# Altium footprint library pcb.PcbLib: 397 footprints (part 12 of 25)
Each footprint in its own frame and in the unit in brackets; x right, y up, seen from the top. Pads: shape width x height; smd on the part's side, far side on the other; paste and mask are expansions set on the pad; w line width, h text height; cw(c..) or ccw(c..) is an arc to the next point about the centre after c.
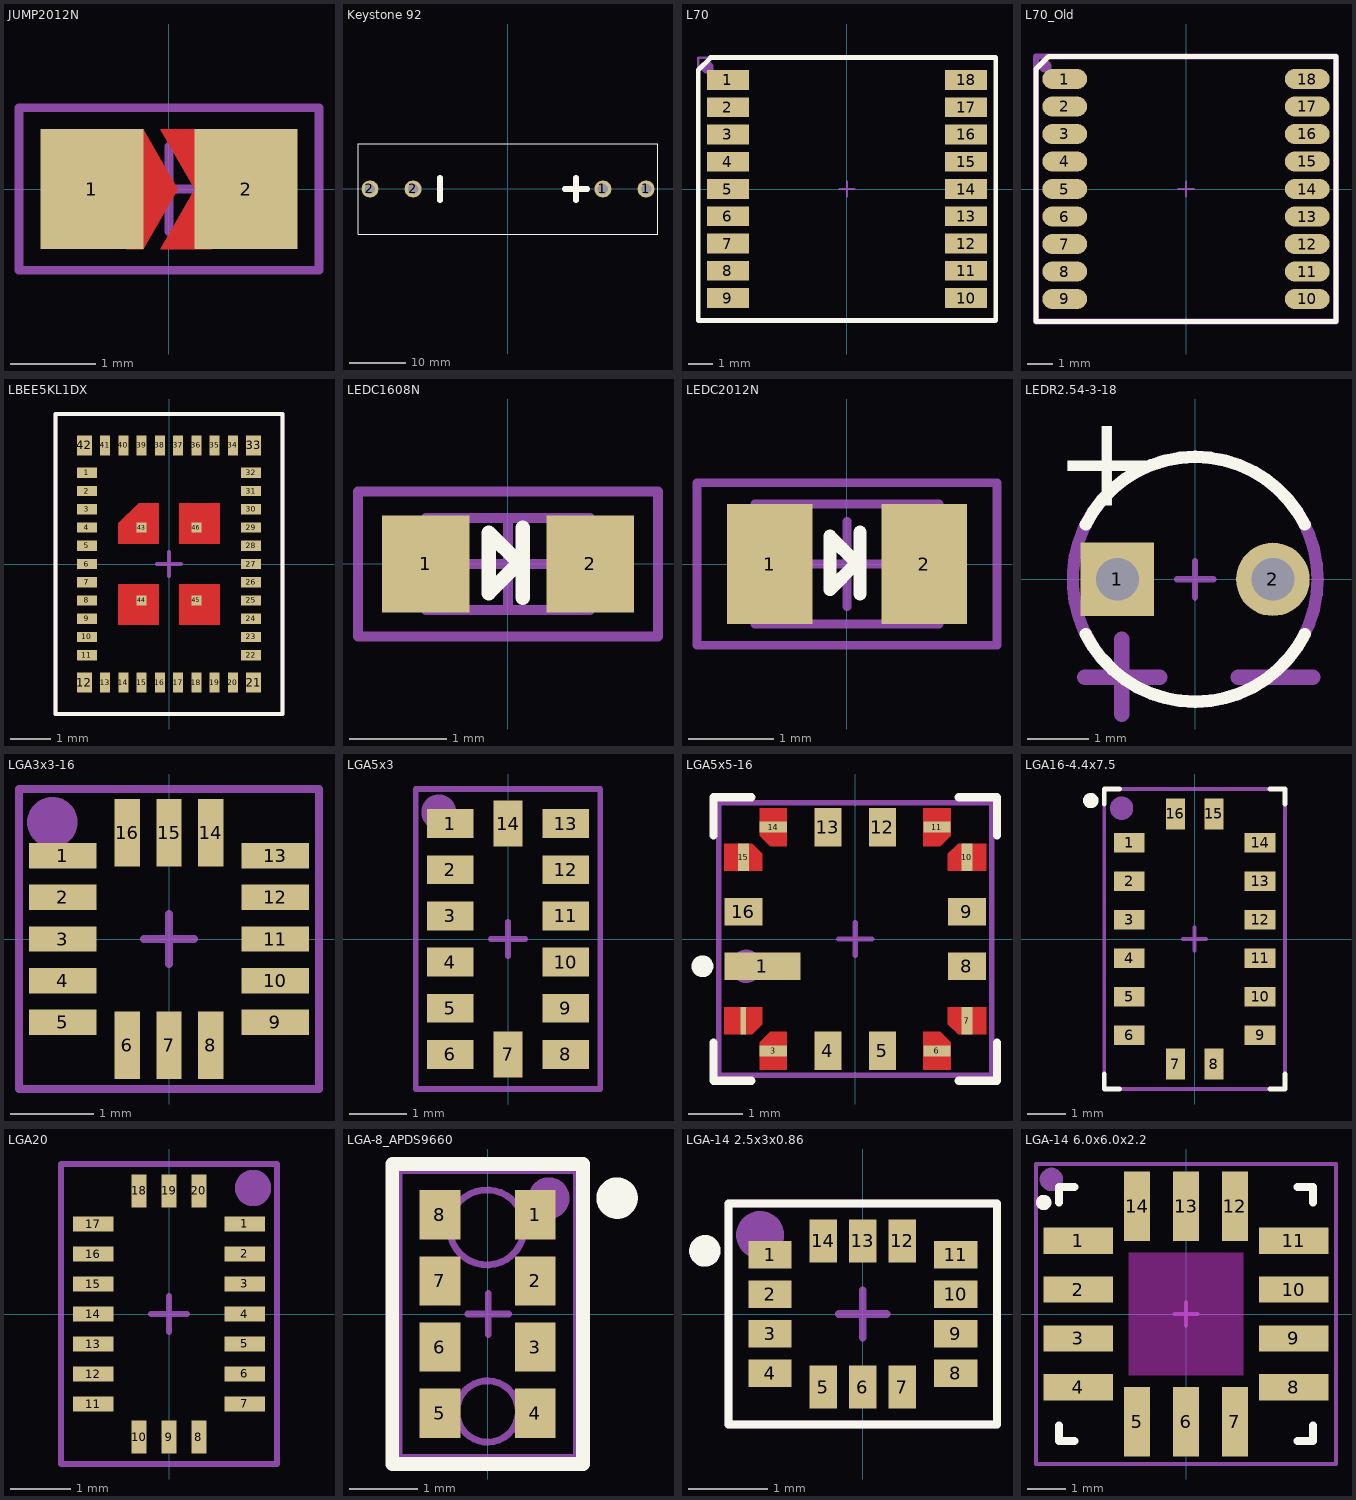
[diagram p11: the footprints below, top view; thin cyan lines are the x and y axes]

## JUMP2012N [mm]
height 0.65
pads (2):
  rect 1.2x1.4 smd: 1(-0.9,0) 2(0.9,0)
Top Layer:
  region: -0.5,0.7 -0.3,0.7 0.1,0 -0.3,-0.7 -0.5,-0.7
  region: 0.5,0.7 -0.1,0.7 0.3,0 -0.1,-0.7 0.5,-0.7
Top Solder:
  rectangle: -0.6,-0.8 0.4,0.8
Mechanical 15:
  lines w0.1: -0.5,0 0.5,0 ; 0,-0.5 0,0.5 ; -1.75,-0.95 1.75,-0.95 1.75,0.95 -1.75,0.95 -1.75,-0.95
  text ".Designator" at -1.575,-0.711 h0.51
3D body: height 0.65, standoff 0, extent -1.075,-0.7 1.075,0.7

## Keystone 92 [mm]
pads (4):
  round 3 hole 1.85: 1(16.765,0) 1(24.385,0) 2(-24.385,0) 2(-16.765,0)
Top Overlay:
  lines w0.2: -26.5,-8 26.5,-8 26.5,8 -26.5,8 -26.5,-8
  lines w1: -12,-2 -12,2 -12,1 ; 10,0 14,0 ; 12,-2 12,2
3D body "AA_battery_clip_92.STEP": height 15.35, standoff -4.01, extent -26.025,-7.6 -16.5,7.6
3D body "AA_battery_clip_92.STEP": height 15.35, standoff -4.01, extent 16.5,-7.6 26.025,7.6

## L70 [mm]
height 1.8
pads (18):
  rect 1.7x0.8 smd paste-10: 1(-4.8,4.4) 2(-4.8,3.3) 3(-4.8,2.2) 4(-4.8,1.1) 5(-4.8,0) 6(-4.8,-1.1) 7(-4.8,-2.2) 8(-4.8,-3.3) 9(-4.8,-4.4) 10(4.8,-4.4) 11(4.8,-3.3) 12(4.8,-2.2) 13(4.8,-1.1) 14(4.8,0) 15(4.8,1.1) 16(4.8,2.2) 17(4.8,3.3) 18(4.8,4.4)
Top Overlay:
  lines w0.2: -6,-5.3 6,-5.3 6,5.3 -5.5,5.3 -6,4.8 -6,-5.3
Top Paste:
  region: -4.85,4.8 -6.05,4.8 -6.05,4 -4.85,4
  region: -4.05,4.7 -4.85,4.7 -4.85,4.1 -4.05,4.1
  region: -4.85,3.7 -6.05,3.7 -6.05,2.9 -4.85,2.9
  region: -4.05,3.6 -4.85,3.6 -4.85,3 -4.05,3
  region: -4.85,2.6 -6.05,2.6 -6.05,1.8 -4.85,1.8
  region: -4.05,2.5 -4.85,2.5 -4.85,1.9 -4.05,1.9
  region: -4.85,1.5 -6.05,1.5 -6.05,0.7 -4.85,0.7
  region: -4.05,1.4 -4.85,1.4 -4.85,0.8 -4.05,0.8
  region: -4.85,0.4 -6.05,0.4 -6.05,-0.4 -4.85,-0.4
  region: -4.05,0.3 -4.85,0.3 -4.85,-0.3 -4.05,-0.3
  region: -4.85,-0.7 -6.05,-0.7 -6.05,-1.5 -4.85,-1.5
  region: -4.05,-0.8 -4.85,-0.8 -4.85,-1.4 -4.05,-1.4
  region: -4.85,-1.8 -6.05,-1.8 -6.05,-2.6 -4.85,-2.6
  region: -4.05,-1.9 -4.85,-1.9 -4.85,-2.5 -4.05,-2.5
  region: -4.85,-2.9 -6.05,-2.9 -6.05,-3.7 -4.85,-3.7
  region: -4.05,-3 -4.85,-3 -4.85,-3.6 -4.05,-3.6
  region: -4.85,-4 -6.05,-4 -6.05,-4.8 -4.85,-4.8
  region: -4.05,-4.1 -4.85,-4.1 -4.85,-4.7 -4.05,-4.7
  rectangle: 4.85,4 6.05,4.8
  rectangle: 4.05,4.1 4.85,4.7
  rectangle: 4.85,2.9 6.05,3.7
  rectangle: 4.05,3 4.85,3.6
  rectangle: 4.85,1.8 6.05,2.6
  rectangle: 4.05,1.9 4.85,2.5
  rectangle: 4.85,0.7 6.05,1.5
  rectangle: 4.05,0.8 4.85,1.4
  rectangle: 4.85,-0.4 6.05,0.4
  rectangle: 4.05,-0.3 4.85,0.3
  rectangle: 4.85,-1.5 6.05,-0.7
  rectangle: 4.05,-1.4 4.85,-0.8
  rectangle: 4.85,-2.6 6.05,-1.8
  rectangle: 4.05,-2.5 4.85,-1.9
  rectangle: 4.85,-3.7 6.05,-2.9
  rectangle: 4.05,-3.6 4.85,-3
  rectangle: 4.05,-4.7 4.85,-4.1
  rectangle: 4.85,-4.8 6.05,-4
Mechanical 15:
  circle w0.25: c-5.625,4.9 r0.125
  lines w0.1: -0.3,0 0.3,0 ; 0,-0.3 0,0.3 ; -6,-5.3 6,-5.3 6,5.3 -6,5.3 -6,-5.3
  text ".Designator" at -4.3,-2.5 h1.02
3D body: height 2.5, standoff 0, extent -4.85,-5.05 4.85,5.05

## L70_Old [mm]
height 1.8
pads (18):
  oval 1.8x0.8 smd: 1(-4.85,4.4) 2(-4.85,3.3) 3(-4.85,2.2) 4(-4.85,1.1) 5(-4.85,0) 6(-4.85,-1.1) 7(-4.85,-2.2) 8(-4.85,-3.3) 9(-4.85,-4.4) 10(4.85,-4.4) 11(4.85,-3.3) 12(4.85,-2.2) 13(4.85,-1.1) 14(4.85,0) 15(4.85,1.1) 16(4.85,2.2) 17(4.85,3.3) 18(4.85,4.4)
Top Overlay:
  lines w0.2: -6,-5.3 -6,4.8 -5.5,5.3 6,5.3 6,-5.3 -6,-5.3
Mechanical 15:
  circle w0.25: c-5.625,4.9 r0.125
  lines w0.1: -0.3,0 0.3,0 ; 0,-0.3 0,0.3
  lines w0.254: -6,-5.3 -6,5.3 6,5.3 6,-5.3 -6,-5.3
  text ".Designator" at -4.3,-2.5 h1.02
3D body: height 2.5, standoff 0, extent -4.9,-5.1 4.9,5.1

## LBEE5KL1DX [mm]
height 1.1
pads (46):
  rect 0.5x0.25 smd: 1(-2.025,2.25) 2(-2.025,1.8) 3(-2.025,1.35) 4(-2.025,0.9) 5(-2.025,0.45) 6(-2.025,0) 7(-2.025,-0.45) 8(-2.025,-0.9) 9(-2.025,-1.35) 10(-2.025,-1.8) 11(-2.025,-2.25) 22(2.025,-2.25) 23(2.025,-1.8) 24(2.025,-1.35) 25(2.025,-0.9) 26(2.025,-0.45) 27(2.025,0) 28(2.025,0.45) 29(2.025,0.9) 30(2.025,1.35) 31(2.025,1.8) 32(2.025,2.25)
  rect 0.375x0.5 smd: 12(-2.087,-2.925) 21(2.087,-2.925) 33(2.087,2.925) 42(-2.087,2.925)
  rect 0.25x0.5 smd: 13(-1.575,-2.925) 14(-1.125,-2.925) 15(-0.675,-2.925) 16(-0.225,-2.925) 17(0.225,-2.925) 18(0.675,-2.925) 19(1.125,-2.925) 20(1.575,-2.925) 34(1.575,2.925) 35(1.125,2.925) 36(0.675,2.925) 37(0.225,2.925) 38(-0.225,2.925) 39(-0.675,2.925) 40(-1.125,2.925) 41(-1.575,2.925)
  rect 0.25x0.25 smd: 43(-0.675,0.9) 44(-0.675,-0.9) 45(0.675,-0.9) 46(0.675,0.9)
Top Layer:
  region: 0.25,1.5 1.25,1.5 1.25,0.5 0.25,0.5
  region: 0.25,-0.5 0.25,-1.5 1.25,-1.5 1.25,-0.5
  region: -1.25,-0.5 -1.25,-1.5 -0.25,-1.5 -0.25,-0.5
  region: -0.75,1.5 -0.25,1.5 -0.25,0.5 -1.25,0.5 -1.25,1
Top Overlay:
  lines w0.1: -2.8,-3.7 -2.8,3.7 2.8,3.7 2.8,-3.7 -2.8,-3.7
Mechanical 15:
  lines w0.1: -0.3,0 0.3,0 ; 0,-0.3 0,0.3 ; -2.8,-3.7 -2.8,3.7 2.8,3.7 2.8,-3.7 -2.8,-3.7
  text ".Designator" at -2.4,-3.3 h1.02
3D body: height 1.1, standoff 0, extent -2.7,-3.6 2.7,3.6

## LEDC1608N [mm] "Chip LED, Body 1.6x0.8mm, IPC Medium Density"
height 0.6
pads (2):
  rect 0.9x1 smd: 1(-0.85,0) 2(0.85,0)
Top Overlay:
  lines w0.15: 0.15,-0.35 0.15,0.375 ; -0.2,-0.3 -0.2,0.325 0.125,0 0.1,0 -0.2,-0.3
Mechanical 13:
  lines w0.1: -0.85,-0.475 -0.85,0.475 0.85,0.475 0.85,-0.475 -0.85,-0.475
Mechanical 15:
  lines w0.1: -0.475,0 0.475,0 ; 0,-0.475 0,0.475 ; -1.55,-0.75 -1.55,0.75 1.55,0.75 1.55,-0.75 -1.55,-0.75
  text "A" at -1.272,0.868 h1.02
  text "K" at 0.5,0.9 h1.02
  text ".Designator" at -1.372,-0.61 h0.51
3D body: height 0.6, standoff 0, extent -0.85,-0.475 0.85,0.475

## LEDC2012N [mm] "Chip LED, Body 2.0x1.3mm, IPC Medium Density"
height 1.2
pads (2):
  rect 1x1.4 smd: 1(-0.9,0) 2(0.9,0)
Top Overlay:
  lines w0.15: 0.15,-0.35 0.15,0.375 ; -0.2,-0.3 0.1,0 0.125,0 -0.2,0.325 -0.2,-0.3
Mechanical 13:
  lines w0.1: -1.075,-0.7 -1.075,0.7 1.075,0.7 1.075,-0.7 -1.075,-0.7
Mechanical 15:
  lines w0.1: -0.5,0 0.5,0 ; 0,-0.5 0,0.5 ; -1.75,-0.95 -1.75,0.95 1.75,0.95 1.75,-0.95 -1.75,-0.95
  text "K" at 0.864,1.168 h1.02
  text "A" at -1.372,1.168 h1.02
  text ".Designator" at -1.422,-0.762 h0.51
3D body: height 0.65, standoff 0, extent -1.075,-0.7 1.075,0.7

## LEDR2.54-3-18 [mm] "Capacitor, Electrolytic, Radial; Body 6.3 x 8 mm (Dia.xH typ); Pin Spacing 2.5 mm (typ)"
height 8
pads (2):
  rect 1.2x1.2 hole 0.7: 1(-1.27,0)
  round 1.2 hole 0.7: 2(1.27,0)
Top Overlay:
  lines w0.2: -1.789,-0.894 ccw(c0,0) 1.789,-0.894 ; -1.789,0.894 cw(c0,0) 1.789,0.894
  text "+" at -2.3,1.2 h1.5
Mechanical 15:
  circle w0.2: c0,0 r2
  lines w0.1: -0.3,0 0.3,0 ; 0,-0.3 0,0.3
  lines w0.254: -1.8,-1.6 -0.581,-1.6 ; -1.2,-2.2 -1.2,-0.981 ; 0.7,-1.6 1.919,-1.6
  text ".Designator" at -3.25,1.25 h1.02
3D body: height 22.3, standoff 19.3, extent -1.498,-1.499 1.499,1.5
3D body: height 20.8, standoff 18, extent -1.511,-1.506 1.488,1.494

## LGA3x3-16 [mm]
pads (16):
  rect 0.813x0.305 smd paste-0.02 mask+0.05: 1(-1.275,1) 2(-1.275,0.5) 3(-1.275,0) 4(-1.275,-0.5) 5(-1.275,-1) 9(1.275,-1) 10(1.275,-0.5) 11(1.275,0) 12(1.275,0.5) 13(1.275,1)
  rect 0.305x0.813 smd paste-0.02 mask+0.05: 6(-0.5,-1.275) 7(0,-1.275) 8(0.5,-1.275) 14(0.5,1.275) 15(0,1.275) 16(-0.5,1.275)
Mechanical 15:
  circle w0.406: c-1.4,1.4 r0.1
  lines w0.1: -0.3,0 0.3,0 ; 0,-0.3 0,0.3 ; -1.8,-1.8 -1.8,1.8 1.8,1.8 1.8,-1.8 -1.8,-1.8
  text ".Designator" at -1.6,-1.6 h1.02
3D body: height 0.8, standoff 0, extent -1.5,-1.5 1.5,1.5

## LGA5x3 [mm]
pads (14):
  rect 0.8x0.5 smd paste-0.05 mask+0.05: 1(-1,2) 2(-1,1.2) 3(-1,0.4) 4(-1,-0.4) 5(-1,-1.2) 6(-1,-2) 8(1,-2) 9(1,-1.2) 10(1,-0.4) 11(1,0.4) 12(1,1.2) 13(1,2)
  rect 0.5x0.8 smd paste-0.05 mask+0.05: 7(0,-2) 14(0,2)
Mechanical 15:
  circle w0.406: c-1.2,2.2 r0.1
  lines w0.1: -0.3,0 0.3,0 ; 0,-0.3 0,0.3 ; -1.6,-2.6 -1.6,2.6 1.6,2.6 1.6,-2.6 -1.6,-2.6
  text ".Designator" at 1.3,-2.3 h1.02
3D body: height 1, standoff 0, extent -1.5,-2.5 1.5,2.5

## LGA5x5-16 [mm]
pads (16):
  rect 1.4x0.5 smd paste-0.05 mask+0.06: 1(-1.7,-0.5)
  rect 0.1x0.5 smd paste-0.05 mask+0.06: 2(-2.05,-1.5)
  rect 0.5x0.2 smd paste-0.05 mask+0.06: 3(-1.5,-2.05) 6(1.5,-2.05) 11(1.5,2.05) 14(-1.5,2.05)
  rect 0.5x0.7 smd paste-0.05 mask+0.06: 4(-0.5,-2.05) 5(0.5,-2.05) 12(0.5,2.05) 13(-0.5,2.05)
  rect 0.2x0.5 smd paste-0.05 mask+0.06: 7(2.05,-1.5) 10(2.05,1.5) 15(-2.05,1.5)
  rect 0.7x0.5 smd paste-0.05 mask+0.06: 8(2.05,-0.5) 9(2.05,0.5) 16(-2.05,0.5)
Top Layer:
  region: 2.4,-1.75 1.89,-1.75 1.7,-1.56 1.7,-1.25 2.4,-1.25
  region: -1.7,-1.56 -1.89,-1.75 -2.4,-1.75 -2.4,-1.25 -1.7,-1.25
  region: 1.75,-1.89 1.75,-2.4 1.25,-2.4 1.25,-1.7 1.56,-1.7
  region: 1.75,1.89 1.56,1.7 1.25,1.7 1.25,2.4 1.75,2.4
  region: -1.25,-2.4 -1.75,-2.4 -1.75,-1.89 -1.56,-1.7 -1.25,-1.7
  region: 2.4,1.25 1.7,1.25 1.7,1.56 1.89,1.75 2.4,1.75
  region: -1.7,1.56 -1.7,1.25 -2.4,1.25 -2.4,1.75 -1.89,1.75
  region: -1.25,1.7 -1.56,1.7 -1.75,1.89 -1.75,2.4 -1.25,2.4
Top Overlay:
  circle w0.2: c-2.8,-0.5 r0.1
  lines w0.15: -2.6,-1.9 -2.6,-2.6 -1.9,-2.6 ; -2.6,1.9 -2.6,2.6 -1.9,2.6 ; 1.9,-2.6 2.6,-2.6 2.6,-1.9 ; 1.9,2.6 2.6,2.6 2.6,1.9
Mechanical 15:
  circle w0.406: c-2,-0.5 r0.1
  lines w0.1: -0.3,0 0.3,0 ; 0,-0.3 0,0.3 ; -2.5,-2.5 -2.5,2.5 2.5,2.5 2.5,-2.5 -2.5,-2.5
  text ".Designator" at -2.2,-2.2 h1.02
3D body: height 1.7, standoff 0, extent -2.5,-2.5 2.5,2.5

## LGA16-4.4x7.5 [mm]
pads (16):
  rect 0.8x0.5 smd paste-0.05 mask+0.08: 1(-1.7,2.5) 2(-1.7,1.5) 3(-1.7,0.5) 4(-1.7,-0.5) 5(-1.7,-1.5) 6(-1.7,-2.5) 9(1.7,-2.5) 10(1.7,-1.5) 11(1.7,-0.5) 12(1.7,0.5) 13(1.7,1.5) 14(1.7,2.5)
  rect 0.5x0.8 smd paste-0.05 mask+0.08: 7(-0.5,-3.25) 8(0.5,-3.25) 15(0.5,3.25) 16(-0.5,3.25)
Top Overlay:
  circle w0.2: c-2.7,3.6 r0.1
  lines w0.12: -2.35,-3.5 -2.35,-3.9 -1.95,-3.9 ; -2.35,3.5 -2.35,3.9 -1.95,3.9 ; 1.95,-3.9 2.35,-3.9 2.35,-3.5 ; 1.95,3.9 2.35,3.9 2.35,3.5
Mechanical 15:
  circle w0.406: c-1.9,3.4 r0.1
  lines w0.1: -0.3,0 0.3,0 ; 0,-0.3 0,0.3 ; -2.35,-3.9 2.35,-3.9 2.35,3.9 -2.35,3.9 -2.35,-3.9
  text ".Designator" at 1.7,-3.5 h1.02
3D body: height 0.8, standoff 0, extent -2.2,-3.75 2.2,3.75

## LGA20 [mm]
pads (20):
  rect 0.675x0.25 smd paste-0.05 mask+0.05: 1(1.262,1.5) 2(1.262,1) 3(1.262,0.5) 4(1.262,0) 5(1.262,-0.5) 6(1.262,-1) 7(1.262,-1.5) 11(-1.262,-1.5) 12(-1.262,-1) 13(-1.262,-0.5) 14(-1.262,0) 15(-1.262,0.5) 16(-1.262,1) 17(-1.262,1.5)
  rect 0.25x0.55 smd paste-0.05 mask+0.05: 8(0.5,-2.05) 9(0,-2.05) 10(-0.5,-2.05) 18(-0.5,2.05) 19(0,2.05) 20(0.5,2.05)
Mechanical 15:
  circle w0.406: c1.4,2.1 r0.1
  lines w0.1: -0.3,0 0.3,0 ; 0,-0.3 0,0.3 ; -1.8,-2.5 1.8,-2.5 1.8,2.5 -1.8,2.5 -1.8,-2.5
  text ".Designator" at -0.5,-2.1 h1.02
3D body: height 1, standoff 0, extent -1.5,-2.25 1.5,2.25

## LGA-8_APDS9660 [mm]
height 1.55
pads (8):
  rect 0.6x0.72 smd: 1(0.7,1.455) 2(0.7,0.485) 3(0.7,-0.485) 4(0.7,-1.455) 5(-0.7,-1.455) 6(-0.7,-0.485) 7(-0.7,0.485) 8(-0.7,1.455)
Top Overlay:
  circle w0.406: c1.9,1.7 r0.1
  lines w0.2: -1.4,-2.2 1.4,-2.2 1.4,2.2 -1.4,2.2 -1.4,-2.2
Mechanical 15:
  circle w0.406: c0.9,1.7 r0.1
  circle w0.1: c0,-1.43 r0.45
  circle w0.1: c-0.01,1.27 r0.55
  lines w0.1: -0.29,0 0.31,0 ; 0.01,-0.3 0.01,0.3 ; -1.3,-2.1 -1.3,2.1 1.3,2.1 1.3,-2.1 -1.3,-2.1
  text ".Designator" at 1.3,-1.6 h1
3D body: height 1.55, standoff 0, extent -1.18,-1.97 1.18,1.97

## LGA-14 2.5x3x0.86 [mm]
height 0.86
pads (14):
  rect 0.55x0.35 smd paste-0.05 mask+0.05: 1(-1.175,0.75) 2(-1.175,0.25) 3(-1.175,-0.25) 4(-1.175,-0.75) 8(1.175,-0.75) 9(1.175,-0.25) 10(1.175,0.25) 11(1.175,0.75)
  rect 0.35x0.55 smd paste-0.05 mask+0.05: 5(-0.5,-0.925) 6(0,-0.925) 7(0.5,-0.925) 12(0.5,0.925) 13(0,0.925) 14(-0.5,0.925)
Top Overlay:
  circle w0.2: c-2,0.8 r0.1
  lines w0.1: -1.7,-1.4 1.7,-1.4 1.7,1.4 -1.7,1.4 -1.7,-1.4
Mechanical 15:
  circle w0.406: c-1.3,1 r0.1
  lines w0.1: -0.3,0 0.3,0 ; 0,-0.3 0,0.3 ; -1.7,-1.4 -1.7,1.4 1.7,1.4 1.7,-1.4 -1.7,-1.4
  text ".Designator" at -1.4,-1.2 h0.8
3D body: height 0.86, standoff 0, extent -1.6,-1.3 1.6,1.3

## LGA-14 6.0x6.0x2.2 [mm]
height 2.2
pads (14):
  rect 1.8x0.68 smd paste-0.05 mask+0.05: 1(-2.8,1.905) 2(-2.8,0.635) 3(-2.8,-0.635) 4(-2.8,-1.905) 8(2.8,-1.905) 9(2.8,-0.635) 10(2.8,0.635) 11(2.8,1.905)
  rect 0.68x1.8 smd paste-0.05 mask+0.05: 5(-1.27,-2.8) 6(0,-2.8) 7(1.27,-2.8) 12(1.27,2.8) 13(0,2.8) 14(-1.27,2.8)
Top Layer keep-out:
  rectangle: -1.5,-1.6 1.5,1.6
Top Overlay:
  circle w0.2: c-3.7,2.9 r0.1
  lines w0.2: -3.3,-2.9 -3.3,-3.3 -2.9,-3.3 ; -3.3,2.9 -3.3,3.3 -2.9,3.3 ; 2.9,-3.3 3.3,-3.3 3.3,-2.9 ; 2.9,3.3 3.3,3.3 3.3,2.9
Mechanical 15:
  circle w0.406: c-3.5,3.5 r0.1
  lines w0.1: -0.3,0 0.3,0 ; 0,-0.3 0,0.3 ; -3.9,-3.9 3.9,-3.9 3.9,3.9 -3.9,3.9 -3.9,-3.9
  text ".Designator" at -3.6,-3.6 h0.8
3D body: height 2.2, standoff 0, extent -3.1,-3.1 3.1,3.1